# Altium footprint library Wurth_Elektronik_Electromechanic_Wire_to_Board_Connectors_rev16a.PCBLIB: 662 footprints (part 24 of 42)
Each footprint in its own frame and in the unit in brackets; x right, y up, seen from the top. Pads: shape width x height; smd on the part's side, far side on the other; paste and mask are expansions set on the pad; w line width, h text height; cw(c..) or ccw(c..) is an arc to the next point about the centre after c.
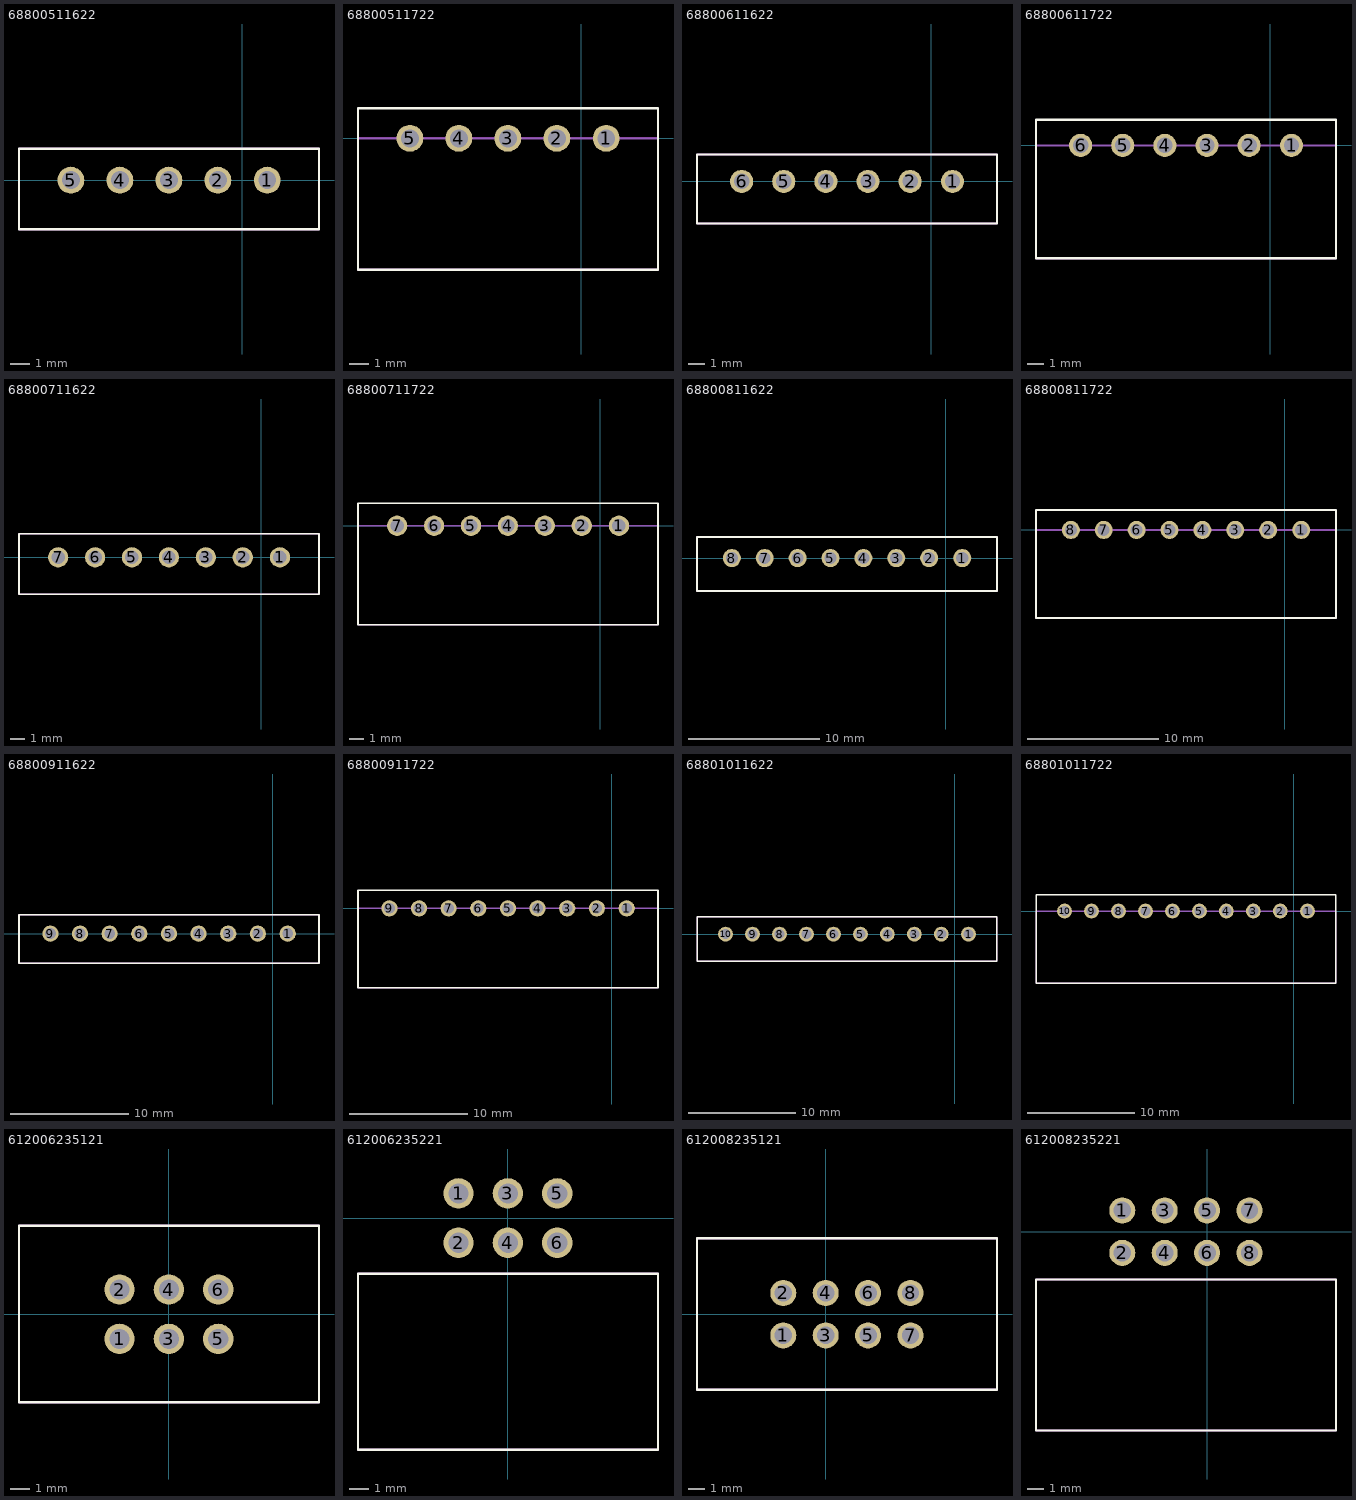
[diagram p23: the footprints below, top view; thin cyan lines are the x and y axes]

## 68800511622 [mil]
pads (5):
  round 54 hole 36: 1(50,0) 2(-49.21,0) 3(-147.64,0) 4(-246.06,0) 5(-344.49,0)
Top Overlay:
  lines w5: -448.82,-98.43 154,-98.43 154,63 -448.82,63 -448.82,-98.43
Mechanical 2:
  text ">NAME" at 176,0 h77.5
Mechanical 4:
  text ">VALUE" at 185,-77.95 h77.5
Mechanical 16:
  lines w5: -448.82,-98.43 154,-98.43 154,63 -448.82,63 -448.82,-98.43
  text "1" at 25,-24.61 h77.5
  text "5" at -369.09,-24.61 h77.5

## 68800511722 [mil]
pads (5):
  round 54 hole 36: 1(50,0) 2(-49.21,0) 3(-147.64,0) 4(-246.06,0) 5(-344.49,0)
Top Overlay:
  lines w5: -448.82,-263.78 154,-263.78 154,60 -448.82,60 -448.82,-263.78
Mechanical 2:
  text ">NAME" at 176,0 h77.5
Mechanical 4:
  text ">VALUE" at 185,-77.95 h77.5
Mechanical 16:
  lines w5: -448.82,-263.78 154,-263.78 154,0 -448.82,0 -448.82,-263.78
  text "1" at 25,-24.61 h77.5
  text "5" at -369.09,-24.61 h77.5

## 68800611622 [mil]
pads (6):
  round 54 hole 36: 1(50,0) 2(-49.21,0) 3(-147.64,0) 4(-246.06,0) 5(-344.49,0) 6(-442.91,0)
Top Overlay:
  lines w5: -547.24,-98.43 154,-98.43 154,63 -547.24,63 -547.24,-98.43
Mechanical 2:
  text ">NAME" at 176,0 h77.5
Mechanical 4:
  text ">VALUE" at 185,-77.95 h77.5
Mechanical 16:
  lines w5: -547.24,-98.43 154,-98.43 154,63 -547.24,63 -547.24,-98.43
  text "1" at 25,-24.61 h77.5
  text "6" at -467.52,-24.61 h77.5

## 68800611722 [mil]
pads (6):
  round 54 hole 36: 1(50,0) 2(-49.21,0) 3(-147.64,0) 4(-246.06,0) 5(-344.49,0) 6(-442.91,0)
Top Overlay:
  lines w5: -547.24,-263.78 154,-263.78 154,60 -547.24,60 -547.24,-263.78
Mechanical 2:
  text ">NAME" at 176,0 h77.5
Mechanical 4:
  text ">VALUE" at 185,-77.95 h77.5
Mechanical 16:
  lines w5: -547.24,-263.78 154,-263.78 154,0 -547.24,0 -547.24,-263.78
  text "1" at 25,-24.61 h77.5
  text "6" at -467.52,-24.61 h77.5

## 68800711622 [mil]
pads (7):
  round 54 hole 36: 1(50,0) 2(-49.21,0) 3(-147.64,0) 4(-246.06,0) 5(-344.49,0) 6(-442.91,0) 7(-541.34,0)
Top Overlay:
  lines w5: -645.67,-98.43 154,-98.43 154,63 -645.67,63 -645.67,-98.43
Mechanical 2:
  text ">NAME" at 176,0 h77.5
Mechanical 4:
  text ">VALUE" at 185,-77.95 h77.5
Mechanical 16:
  lines w5: -645.67,-98.43 154,-98.43 154,63 -645.67,63 -645.67,-98.43
  text "1" at 25,-24.61 h77.5
  text "7" at -565.94,-24.61 h77.5

## 68800711722 [mil]
pads (7):
  round 54 hole 36: 1(50,0) 2(-49.21,0) 3(-147.64,0) 4(-246.06,0) 5(-344.49,0) 6(-442.91,0) 7(-541.34,0)
Top Overlay:
  lines w5: -645.67,-263.78 154,-263.78 154,60 -645.67,60 -645.67,-263.78
Mechanical 2:
  text ">NAME" at 176,0 h77.5
Mechanical 4:
  text ">VALUE" at 185,-77.95 h77.5
Mechanical 16:
  lines w5: -645.67,-263.78 154,-263.78 154,0 -645.67,0 -645.67,-263.78
  text "1" at 25,-24.61 h77.5
  text "7" at -565.94,-24.61 h77.5

## 68800811622 [mil]
pads (8):
  round 54 hole 36: 1(50,0) 2(-49.21,0) 3(-147.64,0) 4(-246.06,0) 5(-344.49,0) 6(-442.91,0) 7(-541.34,0) 8(-639.76,0)
Top Overlay:
  lines w5: -744.09,-98.43 154,-98.43 154,63 -744.09,63 -744.09,-98.43
Mechanical 2:
  text ">NAME" at 176,0 h77.5
Mechanical 4:
  text ">VALUE" at 185,-77.95 h77.5
Mechanical 16:
  lines w5: -744.09,-98.43 154,-98.43 154,63 -744.09,63 -744.09,-98.43
  text "1" at 25,-24.61 h77.5
  text "8" at -664.37,-24.61 h77.5

## 68800811722 [mil]
pads (8):
  round 54 hole 36: 1(50,0) 2(-49.21,0) 3(-147.64,0) 4(-246.06,0) 5(-344.49,0) 6(-442.91,0) 7(-541.34,0) 8(-639.76,0)
Top Overlay:
  lines w5: -744.09,-263.78 154,-263.78 154,60 -744.09,60 -744.09,-263.78
Mechanical 2:
  text ">NAME" at 176,0 h77.5
Mechanical 4:
  text ">VALUE" at 185,-77.95 h77.5
Mechanical 16:
  lines w5: -744.09,-263.78 154,-263.78 154,0 -744.09,0 -744.09,-263.78
  text "1" at 25,-24.61 h77.5
  text "8" at -664.37,-24.61 h77.5

## 68800911622 [mil]
pads (9):
  round 54 hole 36: 1(50,0) 2(-49.21,0) 3(-147.64,0) 4(-246.06,0) 5(-344.49,0) 6(-442.91,0) 7(-541.34,0) 8(-639.76,0) 9(-738.19,0)
Top Overlay:
  lines w5: -842.52,-98.43 154,-98.43 154,63 -842.52,63 -842.52,-98.43
Mechanical 2:
  text ">NAME" at 176,0 h77.5
Mechanical 4:
  text ">VALUE" at 185,-77.95 h77.5
Mechanical 16:
  lines w5: -842.52,-98.43 154,-98.43 154,63 -842.52,63 -842.52,-98.43
  text "1" at 25,-24.61 h77.5
  text "9" at -762.8,-24.61 h77.5

## 68800911722 [mil]
pads (9):
  round 54 hole 36: 1(50,0) 2(-49.21,0) 3(-147.64,0) 4(-246.06,0) 5(-344.49,0) 6(-442.91,0) 7(-541.34,0) 8(-639.76,0) 9(-738.19,0)
Top Overlay:
  lines w5: -842.52,-263.78 154,-263.78 154,60 -842.52,60 -842.52,-263.78
Mechanical 2:
  text ">NAME" at 176,0 h77.5
Mechanical 4:
  text ">VALUE" at 185,-77.95 h77.5
Mechanical 16:
  lines w5: -842.52,-263.78 154,-263.78 154,0 -842.52,0 -842.52,-263.78
  text "1" at 25,-24.61 h77.5
  text "9" at -762.8,-24.61 h77.5

## 68801011622 [mil]
pads (10):
  round 54 hole 36: 1(50,0) 2(-49.21,0) 3(-147.64,0) 4(-246.06,0) 5(-344.49,0) 6(-442.91,0) 7(-541.34,0) 8(-639.76,0) 9(-738.19,0) 10(-836.61,0)
Top Overlay:
  lines w5: -940.94,-98.43 154,-98.43 154,63 -940.94,63 -940.94,-98.43
Mechanical 2:
  text ">NAME" at 176,0 h77.5
Mechanical 4:
  text ">VALUE" at 185,-77.95 h77.5
Mechanical 16:
  lines w5: -940.94,-98.43 154,-98.43 154,63 -940.94,63 -940.94,-98.43
  text "1" at 25,-24.61 h77.5
  text "10" at -861.22,-24.61 h77.5

## 68801011722 [mil]
pads (10):
  round 54 hole 36: 1(50,0) 2(-49.21,0) 3(-147.64,0) 4(-246.06,0) 5(-344.49,0) 6(-442.91,0) 7(-541.34,0) 8(-639.76,0) 9(-738.19,0) 10(-836.61,0)
Top Overlay:
  lines w5: -940.94,-263.78 154,-263.78 154,60 -940.94,60 -940.94,-263.78
Mechanical 2:
  text ">NAME" at 176,0 h77.5
Mechanical 4:
  text ">VALUE" at 185,-77.95 h77.5
Mechanical 16:
  lines w5: -940.94,-263.78 154,-263.78 154,0 -940.94,0 -940.94,-263.78
  text "1" at 25,-24.61 h77.5
  text "10" at -885.83,-24.61 h77.5

## 612006235121 [mil]
pads (6):
  round 61.5 hole 41: 1(-100,-50) 2(-100,50) 3(0,-50) 4(0,50) 5(100,-50) 6(100,50)
Top Overlay:
  lines w5: -303.54,-178.15 304,-178.15 304,179 -303.54,179 -303.54,-178.15
Mechanical 2:
  text ">NAME" at -125,200 h77.5
Mechanical 4:
  text ">VALUE" at -150,-250 h77.5
Mechanical 16:
  lines w5: -303.54,-178.15 304,-178.15 304,179 -303.54,179 -303.54,-178.15
  text "1" at -125,-75 h77.5
  text "6" at 75,25 h77.5

## 612006235221 [mil]
pads (6):
  round 61.5 hole 41: 1(-100,50) 2(-100,-50) 3(0,50) 4(0,-50) 5(100,50) 6(100,-50)
Top Overlay:
  lines w5: -303.54,-469.29 304,-469.29 304,-112.99 -303.54,-112.99 -303.54,-469.29
Mechanical 2:
  text ">NAME" at 360,-254.74 h77.5
Mechanical 4:
  text ">VALUE" at 360,-347.69 h77.5
Mechanical 16:
  lines w5: -303.54,-469.29 304,-469.29 304,-112.99 -303.54,-112.99 -303.54,-469.29
  text "1" at -125,25 h77.5
  text "6" at 75,-75 h77.5

## 612008235121 [mil]
pads (8):
  round 61.5 hole 41: 1(-100,-50) 2(-100,50) 3(0,-50) 4(0,50) 5(100,-50) 6(100,50) 7(200,-50) 8(200,50)
Top Overlay:
  lines w5: -303.54,-178.15 404,-178.15 404,179 -303.54,179 -303.54,-178.15
Mechanical 2:
  text ">NAME" at -125,200 h77.5
Mechanical 4:
  text ">VALUE" at -150,-250 h77.5
Mechanical 16:
  lines w5: -303.54,-178.15 404,-178.15 404,179 -303.54,179 -303.54,-178.15
  text "1" at -125,-75 h77.5
  text "8" at 175,25 h77.5

## 612008235221 [mil]
pads (8):
  round 61.5 hole 41: 1(-200,50) 2(-200,-50) 3(-100,50) 4(-100,-50) 5(0,50) 6(0,-50) 7(100,50) 8(100,-50)
Top Overlay:
  lines w5: -403.54,-469.29 304,-469.29 304,-112.99 -403.54,-112.99 -403.54,-469.29
Mechanical 2:
  text ">NAME" at 360,-254.74 h77.5
Mechanical 4:
  text ">VALUE" at 360,-347.69 h77.5
Mechanical 16:
  lines w5: -403.54,-469.29 304,-469.29 304,-112.99 -403.54,-112.99 -403.54,-469.29
  text "1" at -225,25 h77.5
  text "8" at 75,-75 h77.5